# Altium footprint library Amirreza.PcbLib: 524 footprints (part 28 of 33)
Each footprint in its own frame and in the unit in brackets; x right, y up, seen from the top. Pads: shape width x height; smd on the part's side, far side on the other; paste and mask are expansions set on the pad; w line width, h text height; cw(c..) or ccw(c..) is an arc to the next point about the centre after c.
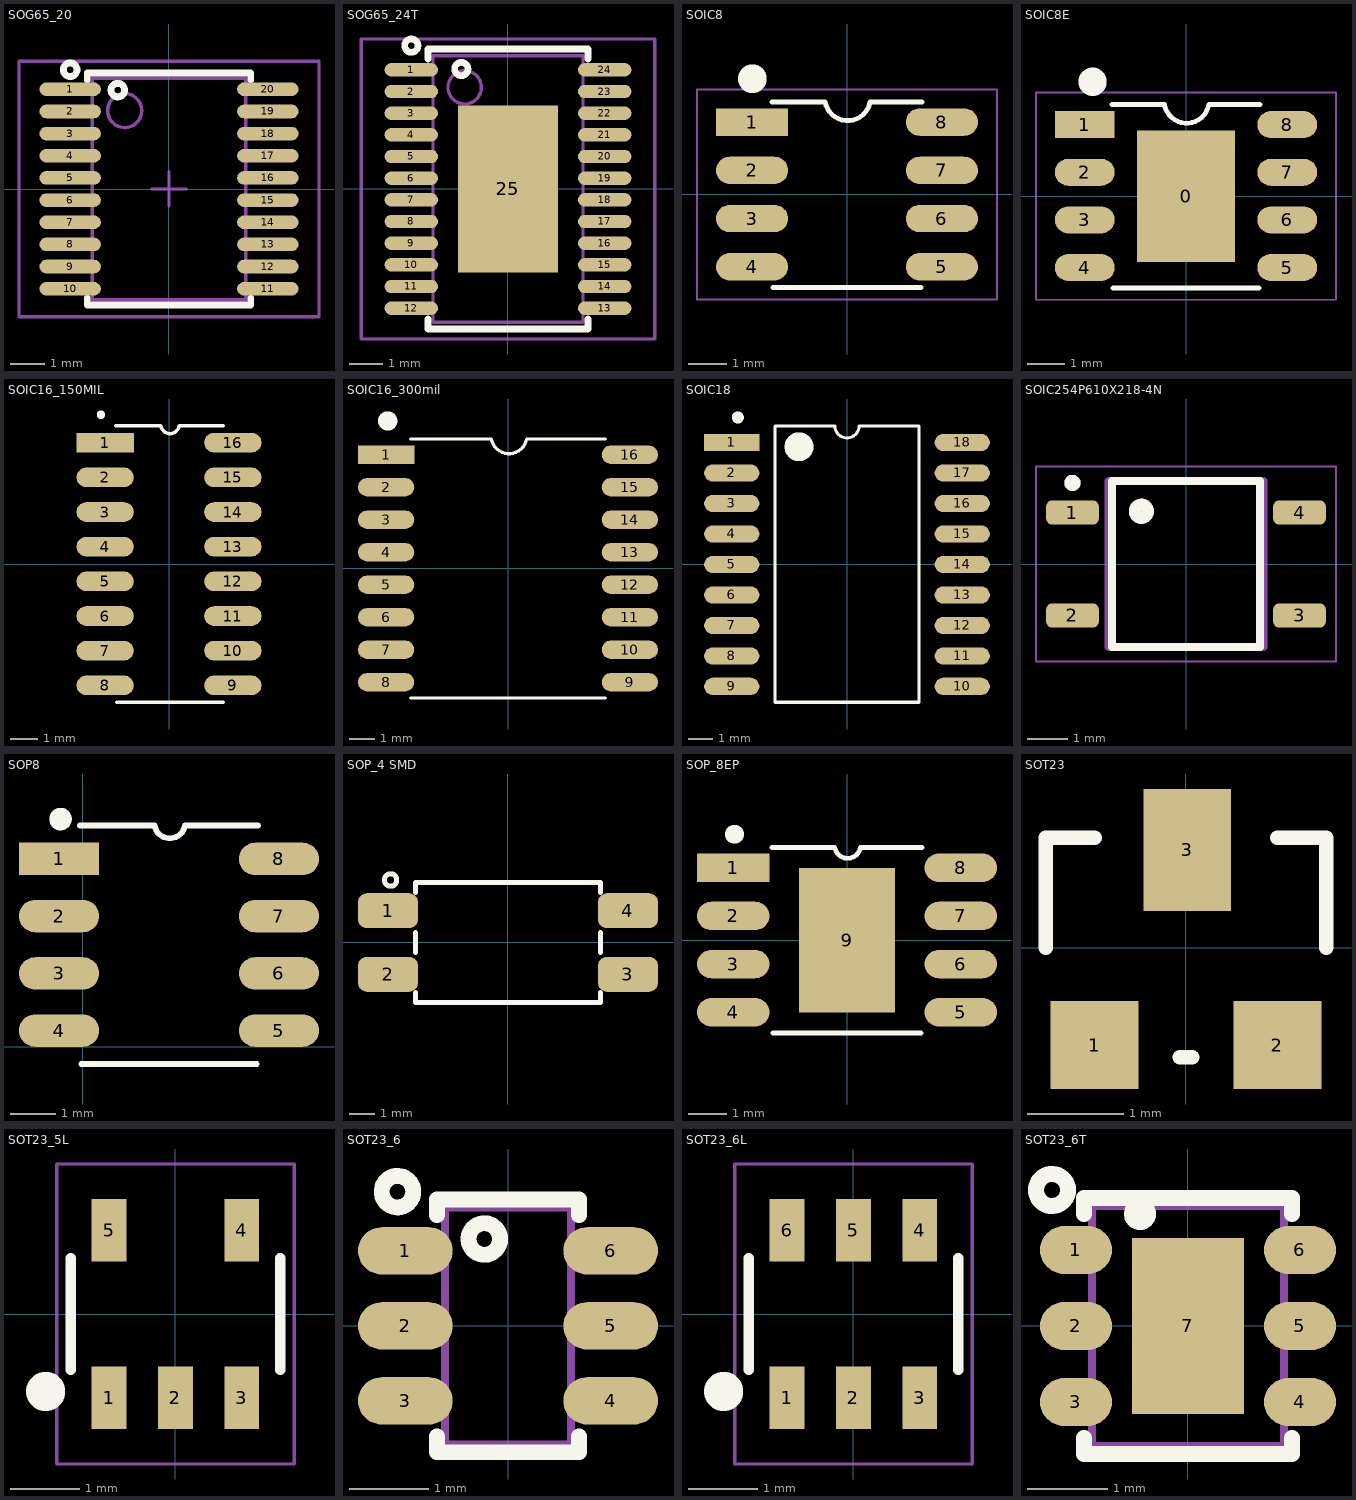
[diagram p27: the footprints below, top view; thin cyan lines are the x and y axes]

## SOG65_20 [mm] "PW TSSOP (TI), MO-153-AC (JEDEC), 20Lead, pitch: 0.65mm, 6.5x4.4x1.2mm"
height 1.2
pads (20):
  oval 1.8x0.4 smd mask+0.075: 1(-2.9,2.925) 2(-2.9,2.275) 3(-2.9,1.625) 4(-2.9,0.975) 5(-2.9,0.325) 6(-2.9,-0.325) 7(-2.9,-0.975) 8(-2.9,-1.625) 9(-2.9,-2.275) 10(-2.9,-2.925) 11(2.9,-2.925) 12(2.9,-2.275) 13(2.9,-1.625) 14(2.9,-0.975) 15(2.9,-0.325) 16(2.9,0.325) 17(2.9,0.975) 18(2.9,1.625) 19(2.9,2.275) 20(2.9,2.925)
Top Overlay:
  circle w0.2: c-2.9,3.5 r0.2
  circle w0.2: c-1.5,2.9 r0.2
  lines w0.2: -2.4,-3.2 -2.4,-3.4 2.4,-3.4 2.4,-3.2 ; -2.4,3.2 -2.4,3.4 2.4,3.4 2.4,3.2
Mechanical 13:
  circle w0.1: c-1.3,2.3 r0.5
  lines w0.1: -2.25,-3.25 -2.25,3.25 2.25,3.25 2.25,-3.25 -2.25,-3.25
Mechanical 15:
  lines w0.1: -0.5,0 0.5,0 ; 0,-0.5 0,0.5 ; -4.4,-3.75 -4.4,3.75 4.4,3.75 4.4,-3.75 -4.4,-3.75
3D body "User Library-TSSOP-20-2.STEP": height 1.2, standoff 0, extent -3.2,-3.25 3.2,3.25

## SOG65_24T [mm] "TSSOP 4.4mm(MAXIM), MO-153-ADT (JEDEC), 24Lead, pitch: 0.65mm, 8x4.4x1.2mm"
height 1.2
pads (25):
  oval 1.6x0.4 smd mask+0.075: 1(-2.9,3.575) 2(-2.9,2.925) 3(-2.9,2.275) 4(-2.9,1.625) 5(-2.9,0.975) 6(-2.9,0.325) 7(-2.9,-0.325) 8(-2.9,-0.975) 9(-2.9,-1.625) 10(-2.9,-2.275) 11(-2.9,-2.925) 12(-2.9,-3.575) 13(2.9,-3.575) 14(2.9,-2.925) 15(2.9,-2.275) 16(2.9,-1.625) 17(2.9,-0.975) 18(2.9,-0.325) 19(2.9,0.325) 20(2.9,0.975) 21(2.9,1.625) 22(2.9,2.275) 23(2.9,2.925) 24(2.9,3.575)
  rect 3x5 smd paste-5 mask+0.1: 25(0,0)
Top Overlay:
  circle w0.2: c-1.4,3.6 r0.2
  circle w0.2: c-2.9,4.3 r0.2
  lines w0.2: -2.4,-3.9 -2.4,-4.2 2.4,-4.2 2.4,-3.9 ; -2.4,3.9 -2.4,4.2 2.4,4.2 2.4,3.9
Top Paste:
  rectangle: -1.3,-1.2 -0.2,-0.2
  rectangle: -1.3,-2.4 -0.2,-1.4
  region: 1.3,-1.4 0.2,-1.4 0.2,-2.4 1.3,-2.4
  region: 1.3,-0.2 0.2,-0.2 0.2,-1.2 1.3,-1.2
  region: 1.3,1.2 0.2,1.2 0.2,0.2 1.3,0.2
  region: 1.3,2.4 0.2,2.4 0.2,1.4 1.3,1.4
  rectangle: -1.3,1.4 -0.2,2.4
  rectangle: -1.3,0.2 -0.2,1.2
Mechanical 13:
  circle w0.1: c-1.3,3.05 r0.5
  lines w0.1: -2.25,-4 2.25,-4 2.25,4 -2.25,4 -2.25,-4
Mechanical 15:
  lines w0.1: -0.5,0 0.5,0 ; 0,-0.5 0,0.5 ; -4.4,-4.5 4.4,-4.5 4.4,4.5 -4.4,4.5 -4.4,-4.5
3D body "PWP0024B.stp": height 1, standoff 0, extent -3.211,-3.9 3.21,3.9

## SOIC8 [mm]
pads (8):
  rect 1.9x0.72 smd: 1(-2.5,1.905)
  oval 1.9x0.72 smd: 2(-2.5,0.635) 3(-2.5,-0.635) 4(-2.5,-1.905) 5(2.5,-1.905) 6(2.5,-0.635) 7(2.5,0.635) 8(2.5,1.905)
Top Overlay:
  circle w0.7: c-2.489,3.048 r0.025
  lines w0.127: -1.975,2.438 -0.574,2.438 ccw(c0.017,2.542) 0.608,2.438 1.975,2.438 ; -1.95,-2.45 1.95,-2.45
Mechanical 13:
  lines w0.05: -3.95,-2.765 -3.95,2.765 3.95,2.765 3.95,-2.765 -3.95,-2.765
3D body "CircuitWorks-SO-8.STEP": height 1.45, standoff 0, extent -2.889,-2.464 2.889,2.438

## SOIC8E [mm]
pads (9):
  rect 2.62x3.51 smd: 0(0,0)
  rect 1.6x0.72 smd: 1(-2.7,1.905)
  oval 1.6x0.72 smd: 2(-2.7,0.635) 3(-2.7,-0.635) 4(-2.7,-1.905) 5(2.7,-1.905) 6(2.7,-0.635) 7(2.7,0.635) 8(2.7,1.905)
Top Overlay:
  circle w0.7: c-2.489,3.048 r0.025
  lines w0.127: -1.975,2.438 -0.574,2.438 ccw(c0.017,2.542) 0.608,2.438 1.975,2.438 ; -1.95,-2.45 1.95,-2.45
Mechanical 13:
  lines w0.05: -4,-2.765 4,-2.765 4,2.765 -4,2.765 -4,-2.765
3D body "CircuitWorks-SO-8.STEP": height 1.45, standoff 0, extent -2.889,-2.464 2.889,2.438

## SOIC16_150MIL [mm]
height 2.65
pads (16):
  rect 2.1x0.72 smd: 1(-2.34,4.445)
  oval 2.1x0.72 smd: 2(-2.34,3.175) 3(-2.34,1.905) 4(-2.34,0.635) 5(-2.34,-0.635) 6(-2.34,-1.905) 7(-2.34,-3.175) 8(-2.34,-4.445) 9(2.34,-4.445) 10(2.34,-3.175) 11(2.34,-1.905) 12(2.34,-0.635) 13(2.34,0.635) 14(2.34,1.905) 15(2.34,3.175) 16(2.34,4.445)
Top Overlay:
  circle w0.254: c-2.494,5.47 r0.025
  lines w0.127: -1.955,5.064 -0.302,5.064 ccw(c0.037,5.123) 0.376,5.064 1.996,5.064 ; -1.908,-5.065 1.992,-5.065
3D body "User Library-SOIC127P600X175-16.step": height 1.65, standoff 0, extent -3.04,-5 3.04,5

## SOIC16_300mil [mm]
height 2.65
pads (16):
  rect 2.2x0.72 smd: 1(-4.763,4.445)
  oval 2.2x0.72 smd: 2(-4.763,3.175) 3(-4.763,1.905) 4(-4.763,0.635) 5(-4.763,-0.635) 6(-4.763,-1.905) 7(-4.763,-3.175) 8(-4.763,-4.445) 9(4.763,-4.445) 10(4.763,-3.175) 11(4.763,-1.905) 12(4.763,-0.635) 13(4.763,0.635) 14(4.763,1.905) 15(4.763,3.175) 16(4.763,4.445)
Top Overlay:
  circle w0.5: c-4.699,5.766 r0.127
  lines w0.127: -3.81,-5.065 3.81,-5.065 ; -3.81,5.064 -0.652,5.064 ccw(c0.037,5.185) 0.727,5.064 3.81,5.064
3D body "User Library-so16w.step": height 3.51, standoff 0.01, extent -5.15,-5.1 5.15,5.1

## SOIC18 [mm]
pads (18):
  rect 2.3x0.72 smd: 1(-4.8,5.08)
  oval 2.3x0.72 smd: 2(-4.8,3.81) 3(-4.8,2.54) 4(-4.8,1.27) 5(-4.8,0) 6(-4.8,-1.27) 7(-4.8,-2.54) 8(-4.8,-3.81) 9(-4.8,-5.08) 10(4.8,-5.08) 11(4.8,-3.81) 12(4.8,-2.54) 13(4.8,-1.27) 14(4.8,0) 15(4.8,1.27) 16(4.8,2.54) 17(4.8,3.81) 18(4.8,5.08)
Top Overlay:
  circle w0.25: c-4.547,6.121 r0.125
  circle w0.6: c-2,4.9 r0.3
  lines w0.127: -3,-5.74 -3,5.766 -0.5,5.766 ccw(c0,5.766) 0.5,5.766 3,5.766 3,-5.74 -3,-5.74
3D body "User Library-SOIC18-300.step": height 2.65, standoff 0, extent -5.15,-5.765 5.15,5.765

## SOIC254P610X218-4N [mm]
pads (4):
  rrect50% 1.3x0.6 smd: 1(-2.8,1.27) 2(-2.8,-1.27) 3(2.8,-1.27) 4(2.8,1.27)
Top Overlay:
  circle w0.2: c-2.8,2 r0.1
  circle w0.3: c-1.1,1.3 r0.16
  lines w0.2: -1.825,-2.05 -1.825,2.05 1.825,2.05 1.825,-2.05 -1.825,-2.05
Mechanical 13:
  circle w0.2: c-2.8,2 r0.1
  circle w0.3: c-1.1,1.3 r0.16
  lines w0.2: -1.905,-2.05 -1.905,2.05 1.905,2.05 1.905,-2.05 -1.905,-2.05
Mechanical 15:
  lines w0.05: -3.7,-2.4 -3.7,2.4 3.7,2.4 3.7,-2.4 -3.7,-2.4
3D body "User Library-CPC1002N_v2.STEP": height 2.18, standoff 0, extent -3.099,-2.146 3.099,2.146

## SOP8 [mm]
pads (8):
  rect 1.78x0.72 smd: 1(-0.53,4.17)
  oval 1.78x0.72 smd: 2(-0.53,2.9) 3(-0.53,1.63) 4(-0.53,0.36) 5(4.347,0.36) 6(4.347,1.63) 7(4.347,2.9) 8(4.347,4.17)
Top Overlay:
  circle w0.25: c-0.498,5.053 r0.125
  lines w0.127: -0.067,4.911 1.586,4.911 ccw(c1.925,4.97) 2.264,4.911 3.884,4.911 ; -0.042,-0.381 3.858,-0.381
3D body "CircuitWorks-SO-8.STEP": height 1.45, standoff 0, extent -0.981,-0.199 4.798,4.703

## SOP_4 SMD [mm] "DIP4, pitch 2.54mm, 300mil Width SMD"
pads (4):
  rrect50% 2.4x1.4 smd: 1(-4.8,1.27) 2(-4.8,-1.27) 3(4.8,-1.27) 4(4.8,1.27)
Top Overlay:
  circle w0.2: c-4.7,2.5 r0.25
  lines w0.2: -3.701,2 -3.701,2.4 3.7,2.4 3.7,2 ; -3.7,-2 -3.7,-2.4 3.7,-2.4 3.7,-2 ; -3.7,-0.4 -3.7,0.4 ; 3.7,-0.4 3.7,0.4
3D body "User Library-FOD817.step": height 4.6, standoff 0, extent -5.23,-2.55 5.23,2.55

## SOP_8EP [mm]
pads (9):
  rect 1.91x0.75 smd: 1(-3,1.905)
  oval 1.91x0.75 smd: 2(-3,0.635) 3(-3,-0.635) 4(-3,-1.905) 5(3,-1.905) 6(3,-0.635) 7(3,0.635) 8(3,1.905)
  rect 2.54x3.81 smd: 9(0,0)
Top Overlay:
  circle w0.25: c-2.968,2.788 r0.125
  lines w0.127: -1.975,2.438 -0.322,2.438 ccw(c0.017,2.498) 0.356,2.438 1.975,2.438 ; -1.95,-2.45 1.95,-2.45
3D body "CircuitWorks-SO-8.STEP": height 1.45, standoff 0, extent -2.889,-2.464 2.889,2.438

## SOT23 [mil]
pads (3):
  rect 36x36 smd: 1(-37.5,-40) 2(37.5,-40)
  rect 36x50 smd: 3(0.5,40)
Top Overlay:
  lines w6: -57.5,0 -57.5,45 -37.5,45 ; -2.5,-45 2.5,-45 ; 37.5,45 57.5,45 57.5,0
3D body "CircuitWorks-SOT-23.step": height 41.65, standoff -1.65, extent -59.06,-49.21 59.06,49.21

## SOT23_5L [mm]
pads (5):
  rect 0.5x0.9 smd: 1(-0.95,-1.2) 2(0,-1.2) 3(0.95,-1.2) 4(0.95,1.2) 5(-0.95,1.2)
Top Overlay:
  circle w0.508: c-1.859,-1.111 r0.025
  lines w0.152: -1.5,-0.8 -1.5,0.8 ; 1.5,-0.8 1.5,0.8
Mechanical 13:
  lines w0.05: -1.7,-2.15 -1.7,2.15 1.7,2.15 1.7,-2.15 -1.7,-2.15
3D body "mic5504-3_3ym5-tr.stp": height 1.18, standoff 0.01, extent -1.5,-1.4 1.488,1.4

## SOT23_6 [mm] "SOT-23-6, DDC, DBV, MICRO6, SOT-26, SOT457, SuperSOT6, TSOP-6, HMC313, TSOT, 1.5x3mm, Pitch 0.65mm, CA531, MO-178AB, MO-193AA"
height 0.8
pads (6):
  oval 1.2x0.6 smd paste-0.05: 1(-1.3,0.95) 2(-1.3,0) 3(-1.3,-0.95) 4(1.3,-0.95) 5(1.3,0) 6(1.3,0.95)
Top Overlay:
  circle w0.2: c-1.4,1.7 r0.2
  circle w0.2: c-0.3,1.1 r0.2
  lines w0.2: -0.9,-1.4 -0.9,-1.6 0.9,-1.6 0.9,-1.4 ; -0.9,1.4 -0.9,1.6 0.9,1.6 0.9,1.4
Mechanical 13:
  lines w0.1: -0.8,-1.5 0.8,-1.5 0.8,1.5 -0.8,1.5 -0.8,-1.5
3D body "User Library-SOT23-6.step": height 1.3, standoff 0, extent -1.5,-1.5 1.5,1.5

## SOT23_6L [mm]
pads (6):
  rect 0.5x0.9 smd: 1(-0.95,-1.2) 2(0,-1.2) 3(0.95,-1.2) 4(0.95,1.2) 5(0,1.2) 6(-0.95,1.2)
Top Overlay:
  circle w0.508: c-1.859,-1.111 r0.025
  lines w0.152: -1.5,-0.8 -1.5,0.8 ; 1.5,-0.8 1.5,0.8
Mechanical 13:
  lines w0.05: -1.7,-2.15 1.7,-2.15 1.7,2.15 -1.7,2.15 -1.7,-2.15
3D body "User Library-sot-23-6-5.step": height 1.25, standoff 0, extent -1.45,-1.416 1.45,1.422

## SOT23_6T [mm] "SuperSOT6, TSOT6, 1.5x3mm, Pitch 0.95mm"
height 0.8
pads (7):
  oval 0.9x0.6 smd paste-0.05: 1(-1.4,0.95) 2(-1.4,0) 3(-1.4,-0.95) 4(1.4,-0.95) 5(1.4,0) 6(1.4,0.95)
  rect 1.4x2.2 smd paste-0.1: 7(0,0)
Top Overlay:
  circle w0.2: c-0.6,1.4 r0.1
  circle w0.2: c-1.7,1.7 r0.2
  lines w0.2: -1.3,-1.4 -1.3,-1.6 1.3,-1.6 1.3,-1.4 ; -1.3,1.4 -1.3,1.6 1.3,1.6 1.3,1.4
Mechanical 13:
  lines w0.1: -1.2,-1.5 -1.2,1.5 1.2,1.5 1.2,-1.5 -1.2,-1.5
3D body "User Library-SOT23-6.step": height 1.3, standoff 0, extent -1.5,-1.5 1.5,1.5